# Altium footprint library biblioteka_pcb.PcbLib: 184 footprints (part 2 of 12)
Each footprint in its own frame and in the unit in brackets; x right, y up, seen from the top. Pads: shape width x height; smd on the part's side, far side on the other; paste and mask are expansions set on the pad; w line width, h text height; cw(c..) or ccw(c..) is an arc to the next point about the centre after c.
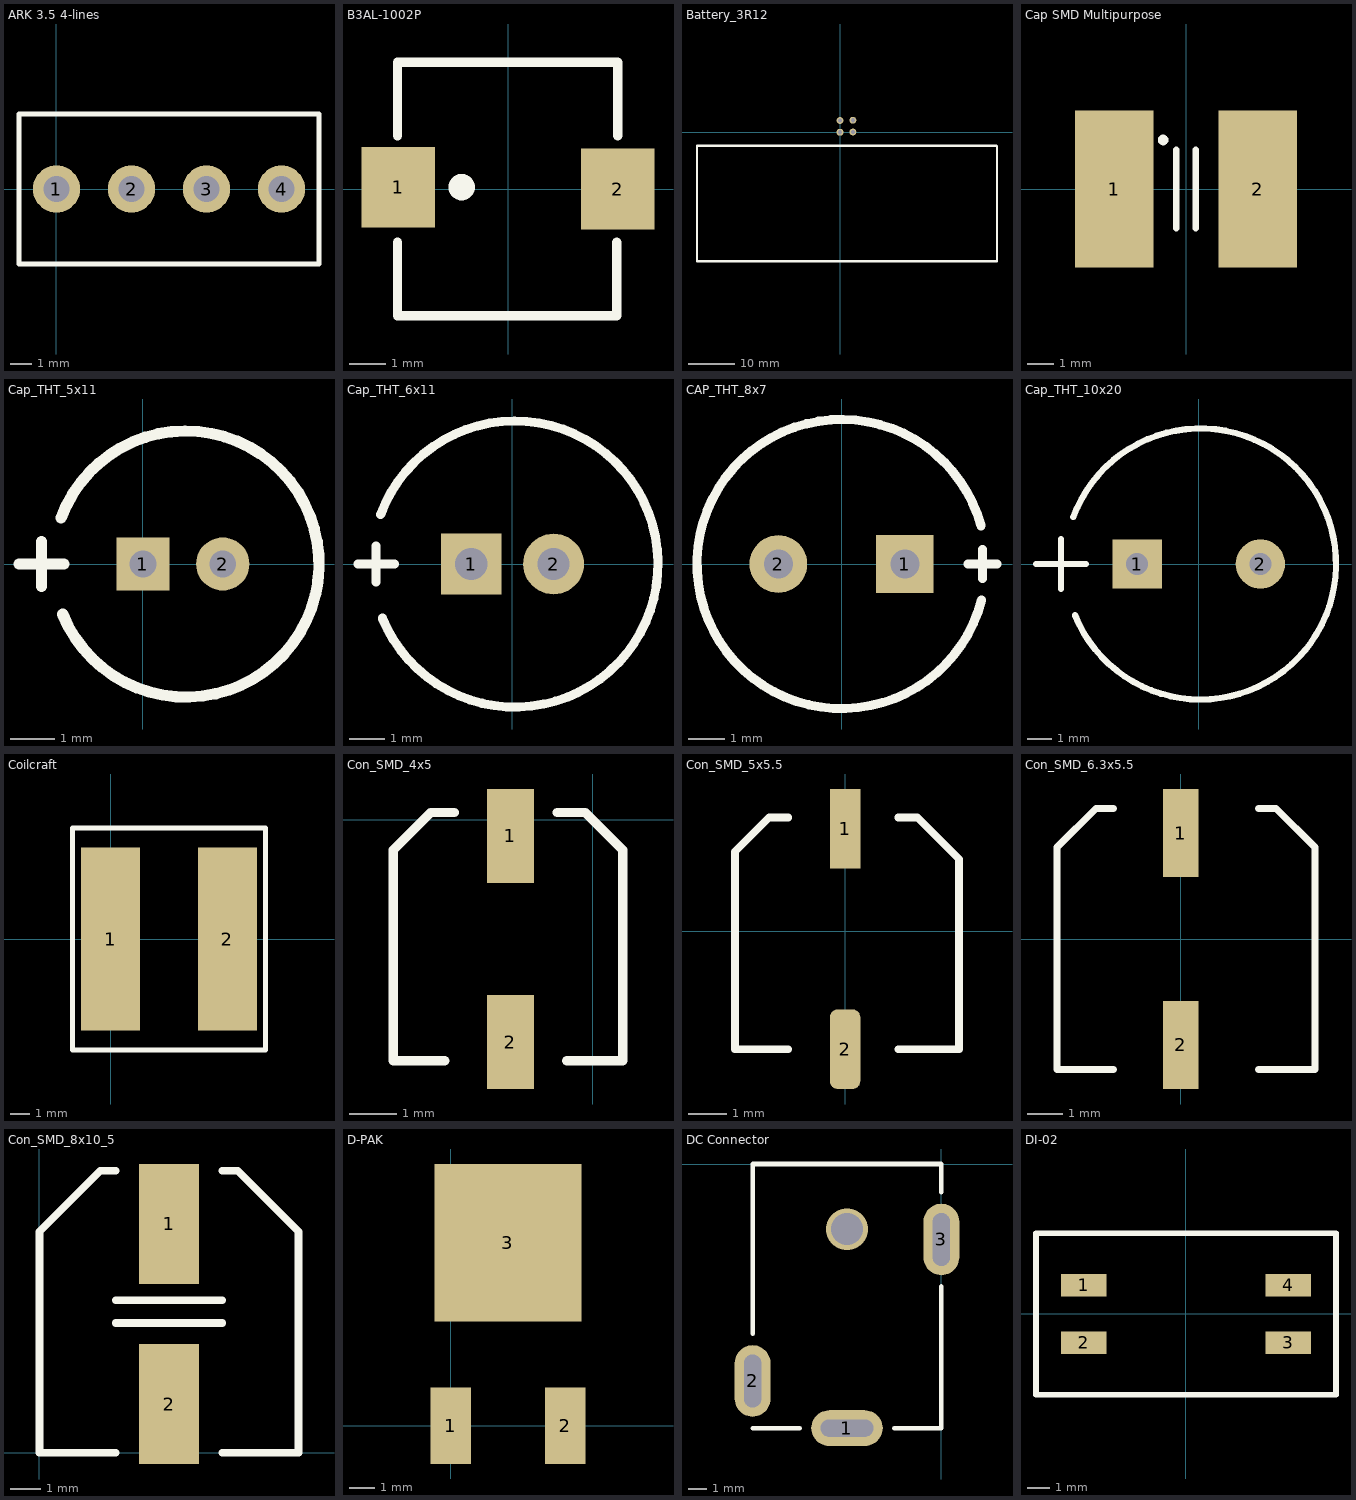
[diagram p1: the footprints below, top view; thin cyan lines are the x and y axes]

## ARK 3.5 4-lines [mm]
pads (4):
  round 2.2 hole 1.2: 1(0,0) 2(3.5,0) 3(7,0) 4(10.5,0)
Top Overlay:
  lines w0.254: -1.75,-3.5 -1.75,3.5 5.25,3.5 12.25,3.5 12.25,-3.5 5.25,-3.5 -1.75,-3.5

## B3AL-1002P [mm]
pads (2):
  rect 2x2.2 smd: 1(-3,0.05) 2(2.975,0)
Top Overlay:
  lines w0.254: -3.025,-1.45 -3.025,-3.45 2.95,-3.45 2.95,-1.45 ; -3.025,1.45 -3.025,3.45 2.975,3.45 ; 2.975,1.45 2.975,3.45 ; 2.975,3.45 2.975,3.45
  lines w0.4: -1.117,0.076 ccw(c-1.275,0.05) -1.115,0.05

## Battery_3R12 [mm] "4,5V Battery model 3R12"
pads (4):
  round 1.5 hole 0.9: 1(0,0) 1(0,2.54) 2(2.782,0.06) 2(2.782,2.6)
Top Overlay:
  lines w0.5: -30.988,-27.94 34.012,-27.94 34.012,-3.072 33.88,-2.94 -30.988,-2.94 -30.988,-27.94
3D body "Battery_3R12.stp": height 68.19, standoff 0, extent -28.956,-25.908 32.044,-4.908
3D body "HDR2X2.stp": height 8.54, standoff -3, extent -1.27,-1.27 3.81,3.81

## Cap SMD Multipurpose [mm] "Created for multi footprint capacitors"
pads (2):
  rect 3x6 smd: 1(-2.738,0) 2(2.738,0)
Top Overlay:
  circle w0.254: c-0.875,1.875 r0.075
  lines w0.254: -0.375,-1.5 -0.375,1.5 ; 0.375,-1.5 0.375,1.5

## Cap_THT_5x11 [mm] "Cap_THT_5x11"
pads (2):
  rect 1.2x1.2 hole 0.6: 1(0,0)
  round 1.2 hole 0.6: 2(1.8,0)
Top Overlay:
  lines w0.254: -2.794,0 -1.778,0 ; -2.286,-0.508 -2.286,0.508 ; -1.846,1.041 cw(c0.968,0) -1.81,-1.133
3D body "Cap_THT_5x11.stp": height 11.5, standoff -2, extent -1.591,-2.495 3.4,2.495

## Cap_THT_6x11 [mm] "Cap_THT_6x11"
pads (2):
  rect 1.7x1.7 hole 0.9: 1(-1.15,0)
  round 1.7 hole 0.9: 2(1.15,0)
Top Overlay:
  lines w0.254: -4.318,0 -3.302,0 ; -3.81,-0.508 -3.81,0.508 ; -3.683,1.388 cw(c0.068,0) -3.636,-1.51
3D body "Cap_THT_6x11.stp": height 11.5, standoff -2, extent -3.125,-3.144 3.15,3.144

## CAP_THT_8x7 [mm]
pads (2):
  rect 1.6x1.6 hole 0.8: 1(1.75,0)
  round 1.6 hole 0.8: 2(-1.75,0)
Top Overlay:
  lines w0.254: 3.5,0 4.3,0 ; 3.857,1.061 ccw(c0,0) 3.875,-0.994 ; 3.9,-0.4 3.9,0.4

## Cap_THT_10x20 [mm] "Cap_THT_10x20"
pads (2):
  rect 2x2 hole 0.9: 1(-2.5,0)
  round 2 hole 0.9: 2(2.5,0)
Top Overlay:
  lines w0.254: -6.604,0 -4.572,0 ; -5.588,-1.016 -5.588,1.016 ; -5.09,1.909 cw(c0.068,0) -5.025,-2.076
3D body "Cap_THT_10x20.stp": height 20, standoff -2, extent -5.077,-5.09 5.1,5.09

## Coilcraft [mm] "Multipurpose footprint for Coilcraft inductors"
pads (2):
  rect 3.05x9.5 smd: 1(0,0) 2(6.05,0)
Top Overlay:
  lines w0.254: -1.975,-5.75 8.025,-5.75 8.025,5.75 -1.975,5.75 -1.975,-5.75

## Con_SMD_4x5 [mm] "SMD electrolytic capacitor"
pads (2):
  rect 1x2 smd: 1(-1.76,-0.34) 2(-1.76,-4.74)
Top Overlay:
  lines w0.2: -3.16,-5.14 -4.26,-5.14 -4.26,-0.64 -3.46,0.16 -2.96,0.16 ; -0.76,0.16 -0.16,0.16 0.64,-0.64 0.64,-5.14 -0.56,-5.14
3D body "Con_SMD_4x5.stp": height 5.48, standoff 0, extent -3.885,-4.64 0.415,-0.12

## Con_SMD_5x5.5 [mm] "SMD electrolytic capacitor"
pads (2):
  rect 0.8x2.1 smd: 1(0,2.7)
  rrect50% 0.8x2.1 smd: 2(0,-3.1)
Top Overlay:
  lines w0.2: -1.5,-3.1 -2.9,-3.1 -2.9,2.1 -2,3 -1.5,3 ; 1.4,-3.1 3,-3.1 3,1.9 1.9,3 1.4,3
3D body "Con_SMD_5x5_5.stp": height 5.81, standoff 0, extent -2.6,-2.76 2.7,2.76

## Con_SMD_6.3x5.5 [mm] "SMD electrolytical capacitor"
pads (2):
  rect 1x2.5 smd: 1(0,3) 2(0,-3)
Top Overlay:
  lines w0.2: -1.9,-3.7 -3.5,-3.7 -3.5,2.6 -2.4,3.7 -1.9,3.7 ; 2.2,-3.7 3.8,-3.7 3.8,2.6 2.7,3.7 2.2,3.7
3D body "Con_SMD_6_3x5_5.stp": height 5.91, standoff 0, extent -3.1,-3.41 3.5,3.41

## Con_SMD_8x10_5 [mm] "Base 8,2mm height 10mm, 220uF, 35V AD6"
pads (2):
  rect 2x4 smd: 1(4.318,7.62) 2(4.318,1.62)
Top Overlay:
  lines w0.254: 2.54,0 0,0 0,7.366 2.032,9.398 2.54,9.398 ; 2.54,4.318 6.096,4.318 ; 2.54,5.08 6.096,5.08 ; 6.096,0 8.636,0 8.636,7.366 6.604,9.398 6.096,9.398
3D body "Con_SMD_8x10_5.stp": height 10.21, standoff 0, extent 0.182,0.472 8.382,8.672

## D-PAK [mm]
pads (3):
  rect 1.6x3 smd: 1(0,0) 2(4.5,0)
  rect 5.8x6.2 smd: 3(2.25,7.2)
3D body "TO252_D-Pak.stp": height 2.2, standoff 0, extent -1,-0.47 5.5,9.47

## DC Connector [mm] "www.lumberd.com Designator: 1613 18"
pads (3):
  oval 3.8x1.9 hole 0.9 slot 2.8 at 0 deg: 1(-5,-14)
  oval 1.9x3.8 hole 0.9 slot 2.8 at 90 deg: 2(-10,-11.5) 3(0,-4)
via -5,-3.45 diameter 2.2 hole 1.7
Top Overlay:
  lines w0.254: -10,-14 -7.5,-14 ; -10,-9 -10,0 0,0 0,-1.5 ; -2.5,-14 0,-14 0,-6.5

## DI-02 [mm] "DIP Switch, 2 Position, Package"
pads (4):
  rect 2x1 smd: 1(-4.496,1.27) 2(-4.496,-1.27) 3(4.504,-1.27) 4(4.504,1.27)
Top Overlay:
  lines w0.254: -6.604,-3.556 6.604,-3.556 6.604,3.556 -6.604,3.556 -6.604,-3.556
3D body "DI-02.stp": height 4.6, standoff 0, extent -5.2,-3 5.2,3